# Altium footprint library ADNB95C.PcbLib: 249 footprints (part 1 of 16)
Each footprint in its own frame and in the unit in brackets; x right, y up, seen from the top. Pads: shape width x height; smd on the part's side, far side on the other; paste and mask are expansions set on the pad; w line width, h text height; cw(c..) or ccw(c..) is an arc to the next point about the centre after c.
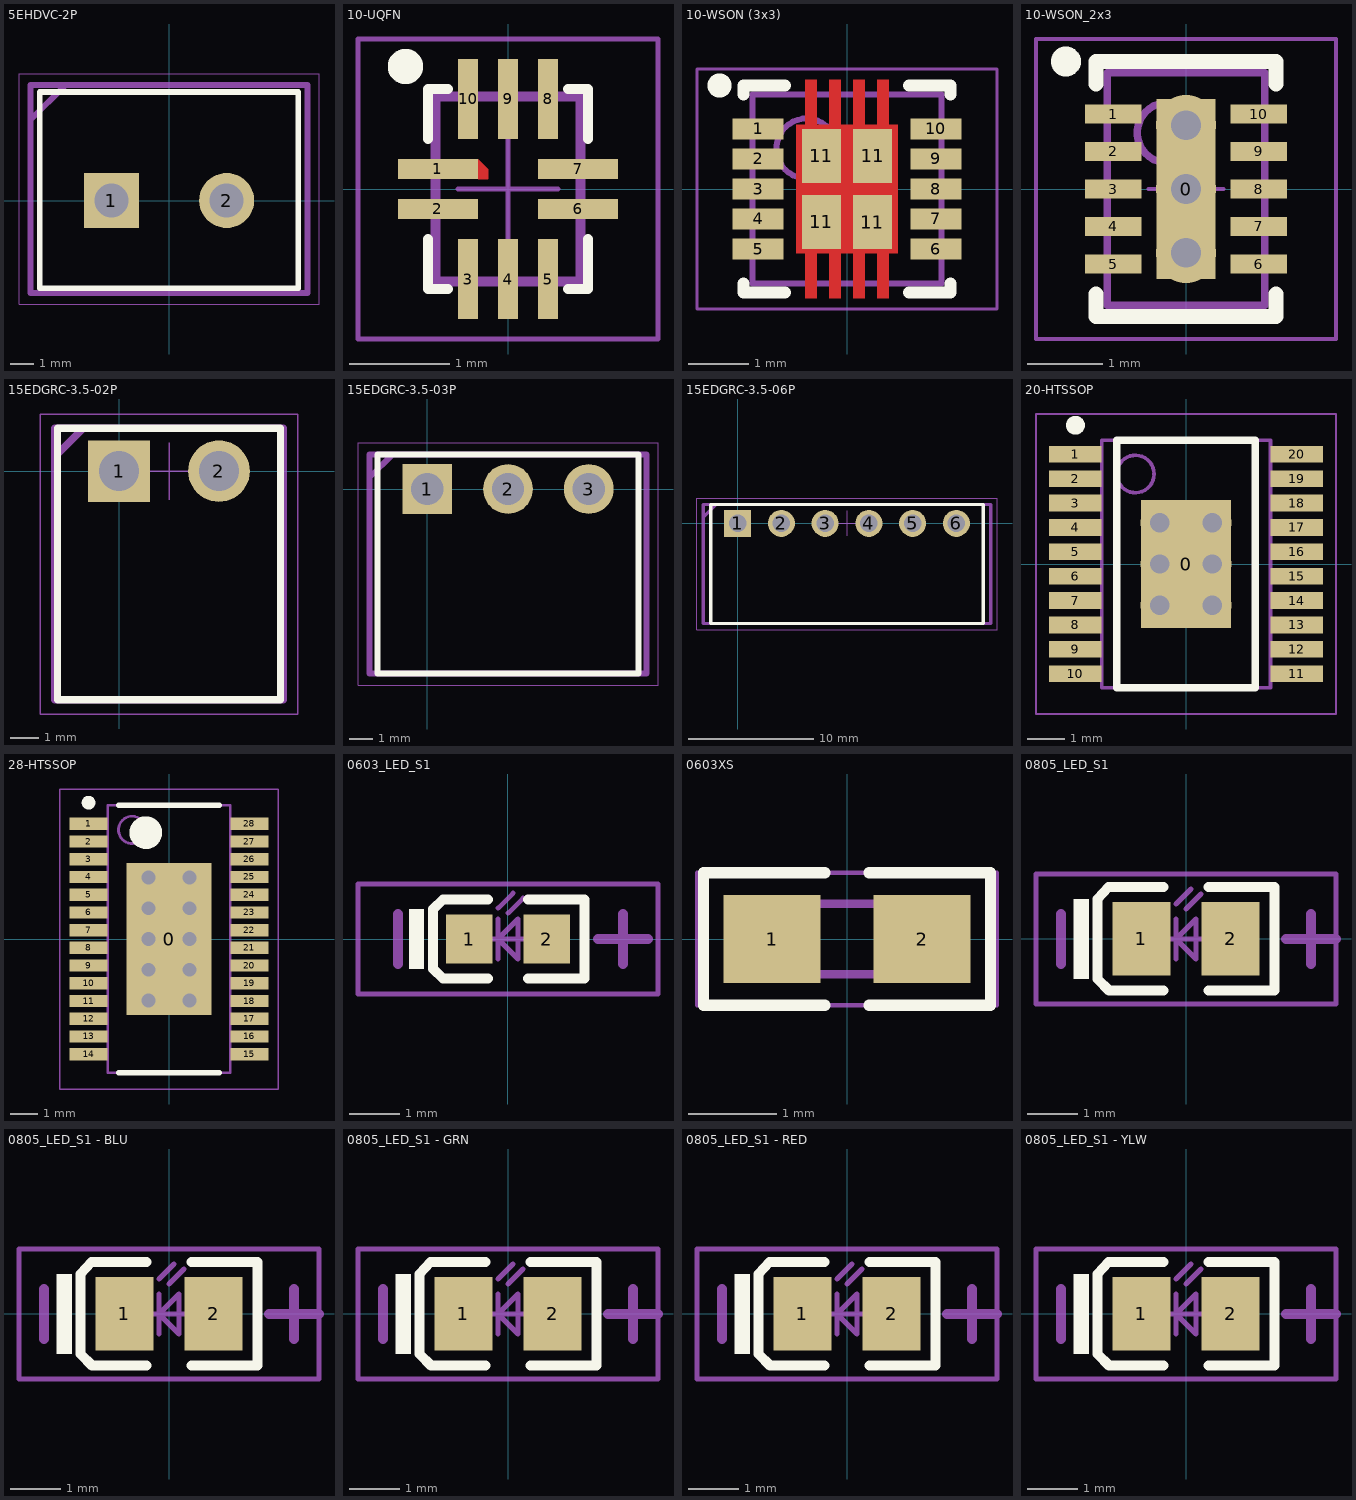
[diagram p0: the footprints below, top view; thin cyan lines are the x and y axes]

## 5EHDVC-2P [mil]
pads (2):
  rect 94x94 hole 58: 1(-98.43,0)
  round 94 hole 58: 2(98.43,0)
Top Overlay:
  lines w10: -220.47,-149.61 -220.47,185.04 220.47,185.04 220.47,-149.61 -220.47,-149.61
Top Designator (Mech7):
  text ".Designator" at 8.24,-0.31 h60
Top Assembly:
  lines w10: -236.22,137.8 -177.17,196.85 ; -236.22,-157.48 236.22,-157.48 236.22,196.85 -236.22,196.85 -236.22,-157.48
Top Courtyard:
  lines w1.97: -255.91,-177.17 -255.91,216.54 255.91,216.54 255.91,-177.17 -255.91,-177.17
3D body "5EHDVC-2P.STEP": height 472.94, standoff -156.98, extent -236.22,-149.61 236.22,185.04

## 10-UQFN [mm] "PQFN, 10-Leads, Body 1.40x1.80mm, Pitch 0.40mm, IPC Medium Density"
height 0.55
pads (10):
  rect 0.8x0.2 smd mask+0.05: 1(-0.7,0.2) 2(-0.7,-0.2) 6(0.7,-0.2) 7(0.7,0.2)
  rect 0.2x0.8 smd mask+0.05: 3(-0.4,-0.9) 4(0,-0.9) 5(0.4,-0.9) 8(0.4,0.9) 9(0,0.9) 10(-0.4,0.9)
Top Layer:
  region: -0.3,0.1 -0.2,0.1 -0.2,0.2 -0.3,0.3
Top Overlay:
  circle w0.254: c-1.025,1.225 r0.05
  lines w0.1: -0.8,-0.5 -0.8,-1 -0.6,-1 ; -0.8,0.5 -0.8,1 -0.6,1 ; 0.6,-1 0.8,-1 0.8,-0.5 ; 0.6,1 0.8,1 0.8,0.5
Top Paste:
  region: -0.2,0.1 -0.2,0.2 -0.3,0.3 -0.3,0.1
Top Solder:
  region: -1.15,0.05 -0.15,0.05 -0.15,0.2 -0.3,0.35 -1.15,0.35
Top Designator (Mech7):
  text ".Designator" at -3.809,-0.254 h0.76
Top Assembly:
  lines w0.1: -0.725,-0.925 -0.725,0.925 0.725,0.925 0.725,-0.925 -0.725,-0.925
Top Courtyard:
  lines w0.05: -0.5,0 0.5,0 ; 0,-0.5 0,0.5 ; -1.5,-1.5 -1.5,1.5 1.5,1.5 1.5,-1.5 -1.5,-1.5
3D body "10UQFN.step": height 0.55, standoff 0, extent -0.725,-0.925 0.725,0.925

## 10-WSON (3x3) [mm] "PSON, 10-Leads, Body 3.00x3.00mm, Pitch 0.50mm, Thermal Pad 2.15x1.46mm, IPC Medium Density"
height 0.8
pads (14):
  rect 0.85x0.35 smd: 1(-1.48,1) 2(-1.48,0.5) 3(-1.48,0) 4(-1.48,-0.5) 5(-1.48,-1) 6(1.48,-1) 7(1.48,-0.5) 8(1.48,0) 9(1.48,0.5) 10(1.48,1)
  rect 0.65x0.9 smd: 11(-0.425,-0.55) 11(-0.425,0.55) 11(0.425,-0.55) 11(0.425,0.55)
Top Layer:
  rectangle: -0.7,1 -0.5,1.825
  rectangle: -0.3,1 -0.1,1.825
  rectangle: 0.5,1 0.7,1.825
  rectangle: 0.1,1 0.3,1.825
  region: -0.1,-1 -0.3,-1 -0.3,-1.825 -0.1,-1.825
  region: -0.5,-1 -0.7,-1 -0.7,-1.825 -0.5,-1.825
  region: 0.3,-1 0.1,-1 0.1,-1.825 0.3,-1.825
  region: 0.7,-1 0.5,-1 0.5,-1.825 0.7,-1.825
  rectangle: -0.85,-1.075 0.85,1.075
Top Overlay:
  circle w0.3: c-2.125,1.725 r0.05
  lines w0.2: -1.725,-1.575 -1.725,-1.725 -1.03,-1.725 ; -1.725,1.575 -1.725,1.725 -1.03,1.725 ; 1.03,-1.725 1.725,-1.725 1.725,-1.575 ; 1.03,1.725 1.725,1.725 1.725,1.575
Top Paste:
  rectangle: -0.7,-1.875 -0.5,-1.075
  region: -0.5,1.875 -0.7,1.875 -0.7,1.075 -0.5,1.075
  rectangle: -0.3,-1.875 -0.1,-1.075
  rectangle: 0.1,-1.875 0.3,-1.075
  rectangle: 0.5,-1.875 0.7,-1.075
  region: -0.1,1.875 -0.3,1.875 -0.3,1.075 -0.1,1.075
  region: 0.3,1.875 0.1,1.875 0.1,1.075 0.3,1.075
  region: 0.7,1.875 0.5,1.875 0.5,1.075 0.7,1.075
Top Solder:
  rectangle: -0.75,1.1 0.75,1.875
  region: 0.75,-1.1 -0.75,-1.1 -0.75,-1.875 0.75,-1.875
Top Designator (Mech7):
  text ".Designator" at -3.809,-0.254 h0.76
Top Assembly:
  circle w0.1: c-0.675,0.675 r0.5
  lines w0.1: -1.575,-1.575 1.575,-1.575 1.575,1.575 -1.575,1.575 -1.575,-1.575
Top Courtyard:
  lines w0.05: -0.5,0 0.5,0 ; 0,-0.5 0,0.5 ; -2.5,-2 2.5,-2 2.5,2 -2.5,2 -2.5,-2
3D body "PSON50P300X80_HS-11N.step": height 0.8, standoff 0, extent -1.576,-1.575 1.576,1.575

## 10-WSON_2x3 [mm] "SON, 10-Leads, Body 3.00x2.00mm, Pitch 0.50mm, Thermal Pad 2.40x0.79mm, IPC Medium Density"
height 0.8
pads (11):
  rect 0.79x2.4 smd mask+0.076: 0(0,0)
  rect 0.75x0.25 smd mask+0.076: 1(-0.97,1) 2(-0.97,0.5) 3(-0.97,0) 4(-0.97,-0.5) 5(-0.97,-1) 6(0.97,-1) 7(0.97,-0.5) 8(0.97,0) 9(0.97,0.5) 10(0.97,1)
via 0,-0.85 diameter 0.8 hole 0.4
via 0,0.85 diameter 0.8 hole 0.4
via 0,0 diameter 0.8 hole 0.4
Top Overlay:
  circle w0.3: c-1.6,1.7 r0.05
  lines w0.2: -1.2,-1.4 -1.2,-1.7 1.2,-1.7 1.2,-1.4 ; -1.2,1.4 -1.2,1.7 1.2,1.7 1.2,1.4
Top Designator (Mech7):
  text ".Designator" at -3.809,-0.254 h0.76
Top Assembly:
  circle w0.1: c-0.25,0.75 r0.4
  lines w0.1: -1.05,-1.55 1.05,-1.55 1.05,1.55 -1.05,1.55 -1.05,-1.55
Top Courtyard:
  lines w0.05: -0.5,0 0.5,0 ; 0,-0.5 0,0.5 ; -2,-2 2,-2 2,2 -2,2 -2,-2
3D body "10-WSON_2x3.step": height 0.8, standoff 0, extent -1.13,-1.55 1.13,1.55

## 15EDGRC-3.5-02P [mil]
height 275.59
pads (2):
  rect 85x85 hole 55.12: 1(0,0)
  round 85 hole 55.12: 2(137.8,0)
Top Overlay:
  lines w10: -84.65,-314.96 -84.65,59.06 222.44,59.06 222.44,-314.96 -84.65,-314.96
Top Designator (Mech7):
  text ".Designator" at -231.01,-147.95 h60
Top Assembly:
  lines w10: -88.58,19.68 -49.21,59.06 -39.37,59.06 ; -68.9,59.06 -59.06,59.06 ; -88.58,-314.96 226.38,-314.96 226.38,59.06 -88.58,59.06 -88.58,-314.96
Top Courtyard:
  lines w1.97: 29.53,0 108.27,0 ; 68.9,-39.37 68.9,39.37 ; -108.27,-334.65 -108.27,78.74 246.06,78.74 246.06,-334.65 -108.27,-334.65
3D body "20020110c022a01lf.stp": height 283.96, standoff -138.28, extent -96.46,-314.96 234.25,47.25

## 15EDGRC-3.5-03P [mil]
height 275.59
pads (3):
  rect 85x85 hole 55.12: 1(0,0)
  round 85 hole 55.12: 2(137.8,0) 3(275.59,0)
Top Overlay:
  lines w10: -84.65,-314.96 360.24,-314.96 360.24,59.06 -84.65,59.06 -84.65,-314.96
Top Designator (Mech7):
  text ".Designator" at -162.11,-147.95 h60
Top Assembly:
  lines w10: -98.43,19.68 -59.06,59.06 ; -98.43,-314.96 -98.43,59.06 374.02,59.06 374.02,-314.96 -98.43,-314.96
Top Courtyard:
  lines w1.97: 98.43,0 177.17,0 ; 137.8,-39.37 137.8,39.37 ; -118.11,-334.65 393.7,-334.65 393.7,78.74 -118.11,78.74 -118.11,-334.65
3D body "20020110c034a01lf.stp": height 283.96, standoff -138.28, extent -96.46,-314.17 372.05,48.03

## 15EDGRC-3.5-06P [mil]
height 275.59
pads (6):
  rect 85x85 hole 55.12: 1(0,0)
  round 85 hole 55.12: 2(137.8,0) 3(275.59,0) 4(413.39,0) 5(551.18,0) 6(688.98,0)
Top Overlay:
  lines w10: -84.65,-314.96 773.62,-314.96 773.62,59.06 -84.65,59.06 -84.65,-314.96
Top Designator (Mech7):
  text ".Designator" at 44.59,-147.95 h60
Top Assembly:
  lines w10: -108.27,19.68 -68.9,59.06 -59.06,59.06 ; -108.27,-314.96 797.24,-314.96 797.24,59.06 -108.27,59.06 -108.27,-314.96
Top Courtyard:
  lines w1.97: 305.12,0 383.86,0 ; 344.49,-39.37 344.49,39.37 ; -127.95,-334.65 816.93,-334.65 816.93,78.74 -127.95,78.74 -127.95,-334.65
3D body "20020110c061a01lf.stp": height 283.96, standoff -138.28, extent -96.45,-314.17 785.44,48.03

## 20-HTSSOP [mm] "TSOP, 20-Leads, Body 6.50x4.40mm, Pitch 0.65mm, Thermal Pad 3.40x2.40mm, IPC Medium Density"
height 1.2
pads (21):
  rect 2.4x3.4 smd: 0(0,0)
  rect 1.4x0.45 smd: 1(-2.95,2.925) 2(-2.95,2.275) 3(-2.95,1.625) 4(-2.95,0.975) 5(-2.95,0.325) 6(-2.95,-0.325) 7(-2.95,-0.975) 8(-2.95,-1.625) 9(-2.95,-2.275) 10(-2.95,-2.925) 11(2.95,-2.925) 12(2.95,-2.275) 13(2.95,-1.625) 14(2.95,-0.975) 15(2.95,-0.325) 16(2.95,0.325) 17(2.95,0.975) 18(2.95,1.625) 19(2.95,2.275) 20(2.95,2.925)
via 0.7,-1.1 diameter 1.016 hole 0.508
via 0.7,0 diameter 1.016 hole 0.508
via -0.7,0 diameter 1.016 hole 0.508
via -0.7,1.1 diameter 1.016 hole 0.508
via -0.7,-1.1 diameter 1.016 hole 0.508
via 0.7,1.1 diameter 1.016 hole 0.508
Top Overlay:
  circle w0.254: c-2.95,3.7 r0.125
  lines w0.2: -1.85,-3.3 1.85,-3.3 1.85,3.3 -1.85,3.3 -1.85,-3.3
Top Designator (Mech7):
  text ".Designator" at -7.618,-0.319 h1.52
Top Assembly:
  circle w0.1: c-1.35,2.4 r0.5
  lines w0.1: -2.25,-3.3 2.25,-3.3 2.25,3.3 -2.25,3.3 -2.25,-3.3
Top Courtyard:
  lines w0.05: -0.5,0 0.5,0 ; 0,-0.5 0,0.5 ; -4,-4 4,-4 4,4 -4,4 -4,-4
3D body "20-HTSSOP.step": height 1.2, standoff 0, extent -3.2,-3.3 3.2,3.3

## 28-HTSSOP [mm] "TSOP, 28-Leads, Body 9.70x4.40mm, Pitch 0.65mm, Thermal Pad 5.58x3.10mm, IPC Medium Density"
height 1.2
pads (29):
  rect 3.1x5.58 smd: 0(0,0)
  rect 1.4x0.45 smd: 1(-2.95,4.225) 2(-2.95,3.575) 3(-2.95,2.925) 4(-2.95,2.275) 5(-2.95,1.625) 6(-2.95,0.975) 7(-2.95,0.325) 8(-2.95,-0.325) 9(-2.95,-0.975) 10(-2.95,-1.625) 11(-2.95,-2.275) 12(-2.95,-2.925) 13(-2.95,-3.575) 14(-2.95,-4.225) 15(2.95,-4.225) 16(2.95,-3.575) 17(2.95,-2.925) 18(2.95,-2.275) 19(2.95,-1.625) 20(2.95,-0.975) 21(2.95,-0.325) 22(2.95,0.325) 23(2.95,0.975) 24(2.95,1.625) 25(2.95,2.275) 26(2.95,2.925) 27(2.95,3.575) 28(2.95,4.225)
via -0.75,0 diameter 1.016 hole 0.508
via 0.75,0 diameter 1.016 hole 0.508
via 0.75,1.125 diameter 1.016 hole 0.508
via -0.75,1.125 diameter 1.016 hole 0.508
via 0.75,2.25 diameter 1.016 hole 0.508
via -0.75,2.25 diameter 1.016 hole 0.508
via 0.75,-2.25 diameter 1.016 hole 0.508
via -0.75,-2.25 diameter 1.016 hole 0.508
via 0.75,-1.125 diameter 1.016 hole 0.508
via -0.75,-1.125 diameter 1.016 hole 0.508
Top Overlay:
  circle w0.254: c-2.95,5 r0.125
  circle w0.6: c-0.85,3.9 r0.3
  lines w0.2: -1.85,-4.9 1.85,-4.9 ; -1.85,4.9 1.85,4.9
Top Designator (Mech7):
  text ".Designator" at -7.618,-0.469 h1.52
Top Assembly:
  circle w0.1: c-1.35,4 r0.5
  lines w0.1: -2.25,-4.9 -2.25,4.9 2.25,4.9 2.25,-4.9 -2.25,-4.9
Top Courtyard:
  lines w0.05: -0.5,0 0.5,0 ; 0,-0.5 0,0.5 ; -4,-5.5 -4,5.5 4,5.5 4,-5.5 -4,-5.5
3D body "28-HTSSOP.step": height 1.2, standoff 0, extent -3.2,-4.9 3.2,4.9

## 0603_LED_S1 [mm]
pads (2):
  rect 0.93x0.98 smd: 1(-0.77,0) 2(0.77,0)
Top Overlay:
  rectangle: -1.975,-0.6 -1.675,0.6
  lines w0.2: -0.4,-0.79 -1.3,-0.79 -1.5,-0.597 -1.5,0.597 -1.3,0.79 -0.4,0.79 ; 0.4,-0.79 1.535,-0.79 1.535,0.79 0.4,0.79
Top Designator (Mech7):
  text ".Designator" at -3.809,-0.254 h0.76
Top Assembly:
  lines w0.1: -0.4,0 0.4,0 ; -0.2,-0.4 -0.2,0.4 ; -0.195,0.617 0.105,0.917 ; 0.005,0.517 0.305,0.817 ; -0.2,0 0.2,-0.4 0.2,0.4 -0.2,0
  lines w0.203: -2.2,-0.5 -2.2,0.5 ; 1.8,0 2.8,0 ; 2.3,-0.5 2.3,0.5
Top Courtyard:
  lines w0.1: -3,-1.1 3,-1.1 3,1.1 -3,1.1 -3,-1.1
3D body "User Library-LED_0603_R.STEP": height 0.6, standoff 0, extent -0.8,-0.4 0.8,0.4

## 0603XS [mm] "Chip RLC; Body 1.6 x 0.8 mm (LxW typ)"
height 0.6
pads (2):
  rect 1.1x1 smd: 1(-0.85,0) 2(0.85,0)
Top Overlay:
  lines w0.127: -0.25,-0.75 -1.625,-0.75 -1.625,0.75 -0.25,0.75 ; 0.25,-0.75 1.625,-0.75 1.625,0.75 0.25,0.75
Top Designator (Mech7):
  text ".Designator" at -0.962,-0.212 h0.76
Top Assembly:
  lines w0.1: -0.85,-0.4 -0.85,0.4 0.85,0.4 0.85,-0.4 -0.85,-0.4
Top Courtyard:
  lines w0.05: -1.7,-0.75 -1.7,0.75 1.7,0.75 1.7,-0.75 -1.7,-0.75

## 0805_LED_S1 [mm]
pads (2):
  rect 1.16x1.47 smd: 1(-0.89,0) 2(0.89,0)
Top Overlay:
  rectangle: -2.245,-0.8 -1.945,0.8
  lines w0.2: -0.45,-1.035 -1.535,-1.035 -1.77,-0.8 -1.77,0.8 -1.55,1.035 -0.45,1.035 ; 0.45,-1.035 1.77,-1.035 1.77,1.035 0.45,1.035
Top Designator (Mech7):
  text ".Designator" at -3.809,-0.254 h0.76
Top Assembly:
  lines w0.1: -0.4,0 0.4,0 ; -0.2,-0.4 -0.2,0.4 ; -0.2,0.7 0.1,1 ; 0,0.6 0.3,0.9 ; -0.2,0 0.2,-0.4 0.2,0.4 -0.2,0
  lines w0.203: -2.5,-0.5 -2.5,0.5 ; 2,0 3,0 ; 2.5,-0.5 2.5,0.5
Top Courtyard:
  lines w0.1: -3,-1.3 3,-1.3 3,1.3 -3,1.3 -3,-1.3
3D body "User Library-led_0805.step": height 1.1, standoff 0, extent -1.01,-0.625 1.01,0.625

## 0805_LED_S1 - BLU [mm] "Chip LED0805 ; BLUE"
pads (2):
  rect 1.16x1.47 smd: 1(-0.89,0) 2(0.89,0)
Top Overlay:
  rectangle: -2.245,-0.8 -1.945,0.8
  lines w0.2: -0.45,-1.035 -1.535,-1.035 -1.77,-0.8 -1.77,0.8 -1.55,1.035 -0.45,1.035 ; 0.45,-1.035 1.77,-1.035 1.77,1.035 0.45,1.035
Top Designator (Mech7):
  text ".Designator" at -3.809,-0.254 h0.76
Top Assembly:
  lines w0.1: -0.4,0 0.4,0 ; -0.2,-0.4 -0.2,0.4 ; -0.2,0.7 0.1,1 ; 0,0.6 0.3,0.9 ; -0.2,0 0.2,0.4 0.2,-0.4 -0.2,0
  lines w0.203: -2.5,-0.5 -2.5,0.5 ; 2,0 3,0 ; 2.5,-0.5 2.5,0.5
Top Courtyard:
  lines w0.1: -3,-1.3 -3,1.3 3,1.3 3,-1.3 -3,-1.3
3D body "User Library-LED0805_BLUE.STEP": height 0.8, standoff 0, extent -1.05,-0.675 1.05,0.675

## 0805_LED_S1 - GRN [mm] "Chip LED0805 ; GREEN"
pads (2):
  rect 1.16x1.47 smd: 1(-0.89,0) 2(0.89,0)
Top Overlay:
  rectangle: -2.245,-0.8 -1.945,0.8
  lines w0.2: -0.45,-1.035 -1.535,-1.035 -1.77,-0.8 -1.77,0.8 -1.55,1.035 -0.45,1.035 ; 0.45,-1.035 1.77,-1.035 1.77,1.035 0.45,1.035
Top Designator (Mech7):
  text ".Designator" at -3.809,-0.254 h0.76
Top Assembly:
  lines w0.1: -0.4,0 0.4,0 ; -0.2,-0.4 -0.2,0.4 ; -0.2,0.7 0.1,1 ; 0,0.6 0.3,0.9 ; -0.2,0 0.2,-0.4 0.2,0.4 -0.2,0
  lines w0.203: -2.5,-0.5 -2.5,0.5 ; 2,0 3,0 ; 2.5,-0.5 2.5,0.5
Top Courtyard:
  lines w0.1: -3,-1.3 3,-1.3 3,1.3 -3,1.3 -3,-1.3
3D body "User Library-User Library-led_0805 GRE.STEP": height 1.1, standoff 0, extent -1.01,-0.625 1.01,0.625

## 0805_LED_S1 - RED [mm] "Chip LED0805 ; RED"
pads (2):
  rect 1.16x1.47 smd: 1(-0.89,0) 2(0.89,0)
Top Overlay:
  rectangle: -2.245,-0.8 -1.945,0.8
  lines w0.2: -0.45,-1.035 -1.535,-1.035 -1.77,-0.8 -1.77,0.8 -1.55,1.035 -0.45,1.035 ; 0.45,-1.035 1.77,-1.035 1.77,1.035 0.45,1.035
Top Designator (Mech7):
  text ".Designator" at -3.809,-0.254 h0.76
Top Assembly:
  lines w0.1: -0.4,0 0.4,0 ; -0.2,-0.4 -0.2,0.4 ; -0.2,0.7 0.1,1 ; 0,0.6 0.3,0.9 ; -0.2,0 0.2,-0.4 0.2,0.4 -0.2,0
  lines w0.203: -2.5,-0.5 -2.5,0.5 ; 2,0 3,0 ; 2.5,-0.5 2.5,0.5
Top Courtyard:
  lines w0.1: -3,-1.3 3,-1.3 3,1.3 -3,1.3 -3,-1.3
3D body "User Library-led_0805.step": height 1.1, standoff 0, extent -1.01,-0.625 1.01,0.625

## 0805_LED_S1 - YLW [mm] "Chip LED0805 ; YELLOW"
pads (2):
  rect 1.16x1.47 smd: 1(-0.89,0) 2(0.89,0)
Top Overlay:
  rectangle: -2.245,-0.8 -1.945,0.8
  lines w0.2: -0.45,-1.035 -1.535,-1.035 -1.77,-0.8 -1.77,0.8 -1.55,1.035 -0.45,1.035 ; 0.45,-1.035 1.77,-1.035 1.77,1.035 0.45,1.035
Top Designator (Mech7):
  text ".Designator" at -3.809,-0.254 h0.76
Top Assembly:
  lines w0.1: -0.4,0 0.4,0 ; -0.2,-0.4 -0.2,0.4 ; -0.2,0.7 0.1,1 ; 0,0.6 0.3,0.9 ; -0.2,0 0.2,-0.4 0.2,0.4 -0.2,0
  lines w0.203: -2.5,-0.5 -2.5,0.5 ; 2,0 3,0 ; 2.5,-0.5 2.5,0.5
Top Courtyard:
  lines w0.1: -3,-1.3 3,-1.3 3,1.3 -3,1.3 -3,-1.3
3D body "User Library-User Library-led_0805 YEL.STEP": height 1.1, standoff 0, extent -1.01,-0.625 1.01,0.625